# Altium footprint library Molex FFC - FPC Connectors (SMT).PcbLib: 638 footprints (part 31 of 40)
Each footprint in its own frame and in the unit in brackets; x right, y up, seen from the top. Pads: shape width x height; smd on the part's side, far side on the other; paste and mask are expansions set on the pad; w line width, h text height; cw(c..) or ccw(c..) is an arc to the next point about the centre after c.
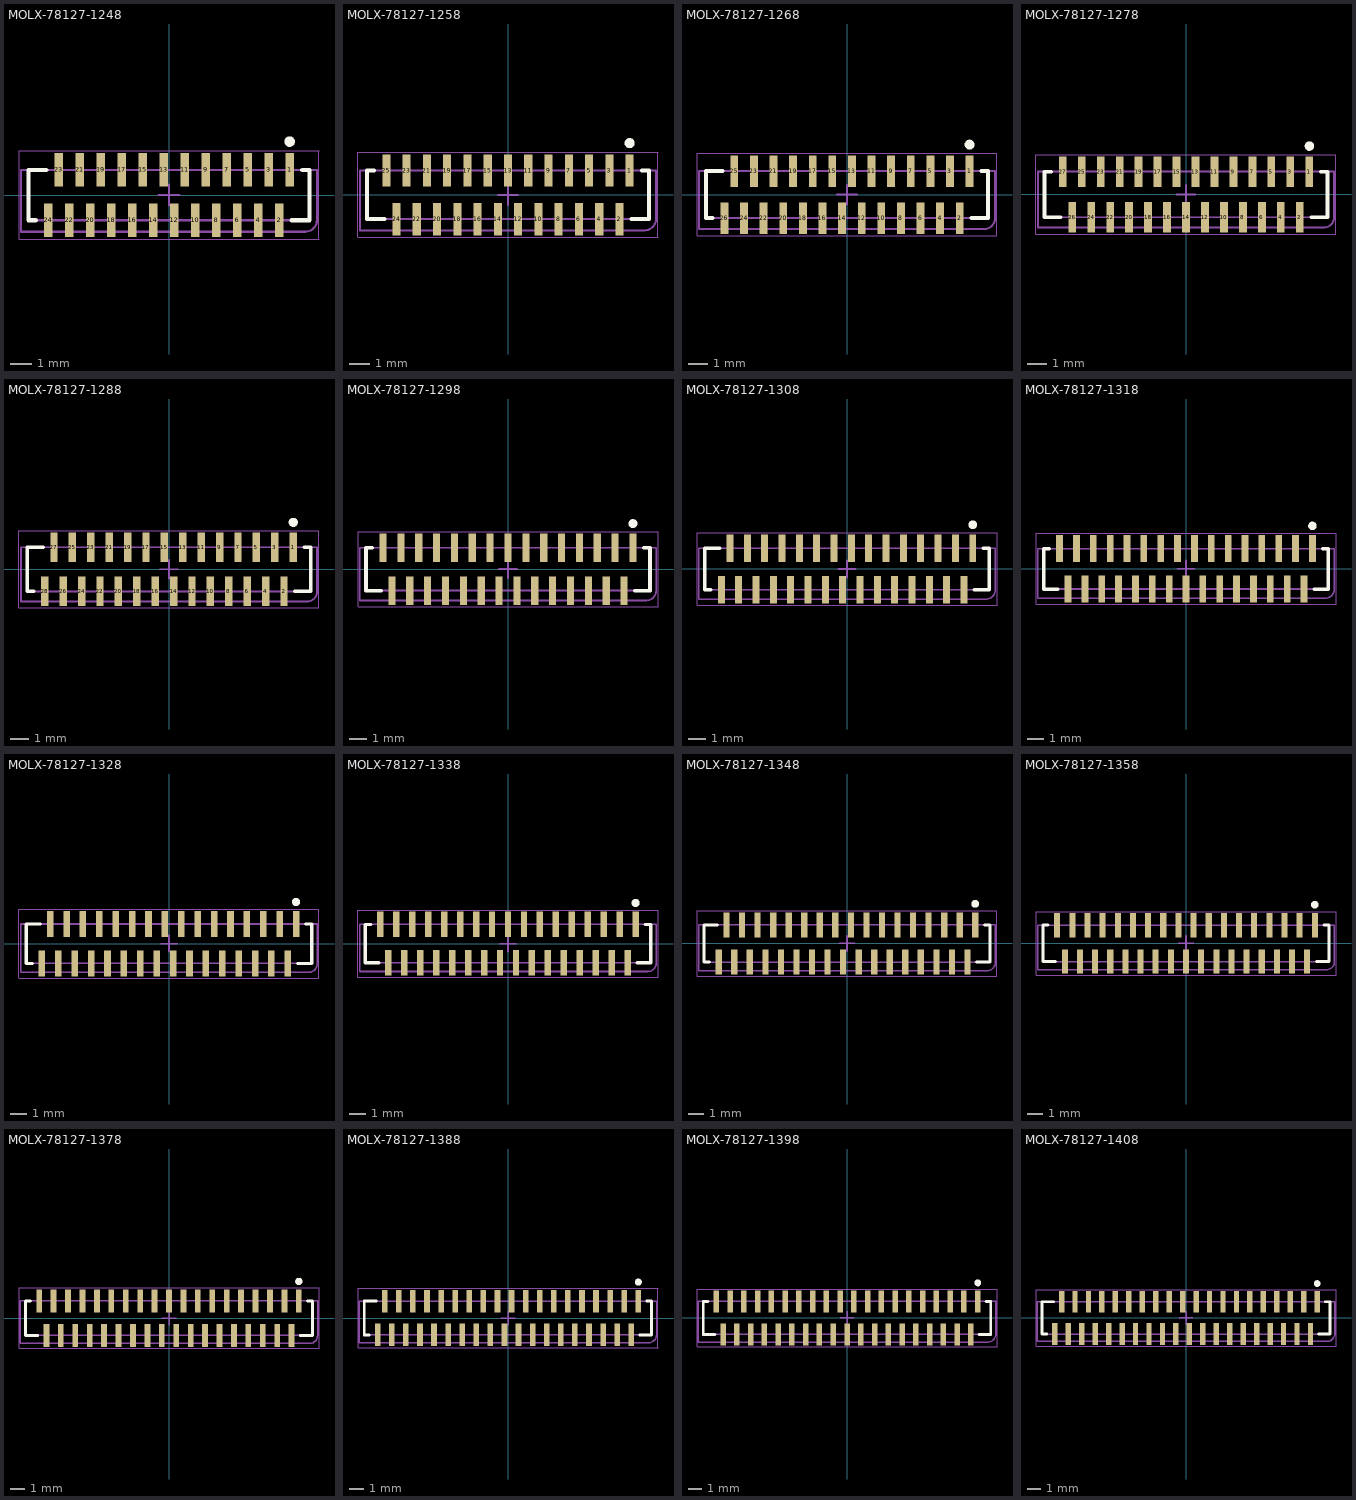
[diagram p30: the footprints below, top view; thin cyan lines are the x and y axes]

## MOLX-78127-1248 [mm] "FPC Connector, 24-Leads, Vertical, Pitch 0.5 mm, Mated Height 4.1 mm, SMT"
height 4.112
pads (24):
  rect 0.4x1.6 smd: 1(5.75,1.2) 2(5.25,-1.2) 3(4.75,1.2) 4(4.25,-1.2) 5(3.75,1.2) 6(3.25,-1.2) 7(2.75,1.2) 8(2.25,-1.2) 9(1.75,1.2) 10(1.25,-1.2) 11(0.75,1.2) 12(0.25,-1.2) 13(-0.25,1.2) 14(-0.75,-1.2) 15(-1.25,1.2) 16(-1.75,-1.2) 17(-2.25,1.2) 18(-2.75,-1.2) 19(-3.25,1.2) 20(-3.75,-1.2) 21(-4.25,1.2) 22(-4.75,-1.2) 23(-5.25,1.2) 24(-5.75,-1.2)
Top Overlay:
  circle w0.25: c5.75,2.55 r0.125
  lines w0.2: -6.35,-1.2 -6.7,-1.2 -6.7,1.2 -5.85,1.2 ; 5.85,-1.2 6.7,-1.2 6.7,1.2 6.35,1.2
Mechanical 13:
  lines w0.1: -6.7,1.2 -6.7,-1.2 6.7,-1.2 6.7,1.2 ; -7.05,-1.75 -7.05,1.2 7.05,1.2 7.05,-1.2 cw(c6.5,-1.2) 6.5,-1.75 -7.05,-1.75 ; -7.05,-1.75 -7.05,-1.75
Mechanical 15:
  lines w0.05: -7.15,-2.1 7.15,-2.1 7.15,2.1 -7.15,2.1 -7.15,-2.1
  lines w0.1: -0.5,0 0.5,0 ; 0,-0.5 0,0.5
3D body: height 0.25, standoff 0, extent -7.05,-1.75 7.05,1.7

## MOLX-78127-1258 [mm] "FPC Connector, 25-Leads, Vertical, Pitch 0.5 mm, Mated Height 4.1 mm, SMT"
height 4.112
pads (25):
  rect 0.4x1.6 smd: 1(6,1.2) 2(5.5,-1.2) 3(5,1.2) 4(4.5,-1.2) 5(4,1.2) 6(3.5,-1.2) 7(3,1.2) 8(2.5,-1.2) 9(2,1.2) 10(1.5,-1.2) 11(1,1.2) 12(0.5,-1.2) 13(0,1.2) 14(-0.5,-1.2) 15(-1,1.2) 16(-1.5,-1.2) 17(-2,1.2) 18(-2.5,-1.2) 19(-3,1.2) 20(-3.5,-1.2) 21(-4,1.2) 22(-4.5,-1.2) 23(-5,1.2) 24(-5.5,-1.2) 25(-6,1.2)
Top Overlay:
  circle w0.25: c6,2.55 r0.125
  lines w0.2: -6.6,1.2 -6.95,1.2 -6.95,-1.2 -6.1,-1.2 ; 6.1,-1.2 6.95,-1.2 6.95,1.2 6.6,1.2
Mechanical 13:
  lines w0.1: -6.95,1.2 -6.95,-1.2 6.95,-1.2 6.95,1.2 ; -7.3,-1.75 6.75,-1.75 ccw(c6.75,-1.2) 7.3,-1.2 7.3,1.2 -7.3,1.2 -7.3,-1.75
Mechanical 15:
  lines w0.05: -7.4,-2.1 7.4,-2.1 7.4,2.1 -7.4,2.1 -7.4,-2.1
  lines w0.1: -0.5,0 0.5,0 ; 0,-0.5 0,0.5
3D body: height 0.25, standoff 0, extent -7.3,-1.75 7.3,1.7

## MOLX-78127-1268 [mm] "FPC Connector, 26-Leads, Vertical, Pitch 0.5 mm, Mated Height 4.1 mm, SMT"
height 4.112
pads (26):
  rect 0.4x1.6 smd: 1(6.25,1.2) 2(5.75,-1.2) 3(5.25,1.2) 4(4.75,-1.2) 5(4.25,1.2) 6(3.75,-1.2) 7(3.25,1.2) 8(2.75,-1.2) 9(2.25,1.2) 10(1.75,-1.2) 11(1.25,1.2) 12(0.75,-1.2) 13(0.25,1.2) 14(-0.25,-1.2) 15(-0.75,1.2) 16(-1.25,-1.2) 17(-1.75,1.2) 18(-2.25,-1.2) 19(-2.75,1.2) 20(-3.25,-1.2) 21(-3.75,1.2) 22(-4.25,-1.2) 23(-4.75,1.2) 24(-5.25,-1.2) 25(-5.75,1.2) 26(-6.25,-1.2)
Top Overlay:
  circle w0.25: c6.25,2.55 r0.125
  lines w0.2: -6.85,-1.2 -7.2,-1.2 -7.2,1.2 -6.35,1.2 ; 6.35,-1.2 7.2,-1.2 7.2,1.2 6.85,1.2
Mechanical 13:
  lines w0.1: -7.2,1.2 -7.2,-1.2 7.2,-1.2 7.2,1.2 ; -7.55,-1.75 -7.55,1.2 7.55,1.2 7.55,-1.2 cw(c7,-1.2) 7,-1.75 -7.55,-1.75
Mechanical 15:
  lines w0.05: -7.65,-2.1 -7.65,2.1 7.65,2.1 7.65,-2.1 -7.65,-2.1
  lines w0.1: -0.5,0 0.5,0 ; 0,-0.5 0,0.5
3D body: height 0.25, standoff 0, extent -7.55,-1.75 7.55,1.7

## MOLX-78127-1278 [mm] "FPC Connector, 27-Leads, Vertical, Pitch 0.5 mm, Mated Height 4.1 mm, SMT"
height 4.112
pads (27):
  rect 0.4x1.6 smd: 1(6.5,1.2) 2(6,-1.2) 3(5.5,1.2) 4(5,-1.2) 5(4.5,1.2) 6(4,-1.2) 7(3.5,1.2) 8(3,-1.2) 9(2.5,1.2) 10(2,-1.2) 11(1.5,1.2) 12(1,-1.2) 13(0.5,1.2) 14(0,-1.2) 15(-0.5,1.2) 16(-1,-1.2) 17(-1.5,1.2) 18(-2,-1.2) 19(-2.5,1.2) 20(-3,-1.2) 21(-3.5,1.2) 22(-4,-1.2) 23(-4.5,1.2) 24(-5,-1.2) 25(-5.5,1.2) 26(-6,-1.2) 27(-6.5,1.2)
Top Overlay:
  circle w0.25: c6.5,2.55 r0.125
  lines w0.2: -7.1,1.2 -7.45,1.2 -7.45,-1.2 -6.6,-1.2 ; 6.6,-1.2 7.45,-1.2 7.45,1.2 7.1,1.2
Mechanical 13:
  lines w0.1: -7.45,1.2 -7.45,-1.2 7.45,-1.2 7.45,1.2 ; -7.8,-1.75 7.249,-1.75 ccw(c7.25,-1.2) 7.8,-1.2 7.8,1.2 -7.8,1.2 -7.8,-1.75
Mechanical 15:
  lines w0.05: -7.9,-2.1 7.9,-2.1 7.9,2.1 -7.9,2.1 -7.9,-2.1
  lines w0.1: -0.5,0 0.5,0 ; 0,-0.5 0,0.5
3D body: height 0.25, standoff 0, extent -7.8,-1.75 7.8,1.7

## MOLX-78127-1288 [mm] "FPC Connector, 28-Leads, Vertical, Pitch 0.5 mm, Mated Height 4.1 mm, SMT"
height 4.112
pads (28):
  rect 0.4x1.6 smd: 1(6.75,1.2) 2(6.25,-1.2) 3(5.75,1.2) 4(5.25,-1.2) 5(4.75,1.2) 6(4.25,-1.2) 7(3.75,1.2) 8(3.25,-1.2) 9(2.75,1.2) 10(2.25,-1.2) 11(1.75,1.2) 12(1.25,-1.2) 13(0.75,1.2) 14(0.25,-1.2) 15(-0.25,1.2) 16(-0.75,-1.2) 17(-1.25,1.2) 18(-1.75,-1.2) 19(-2.25,1.2) 20(-2.75,-1.2) 21(-3.25,1.2) 22(-3.75,-1.2) 23(-4.25,1.2) 24(-4.75,-1.2) 25(-5.25,1.2) 26(-5.75,-1.2) 27(-6.25,1.2) 28(-6.75,-1.2)
Top Overlay:
  circle w0.25: c6.75,2.55 r0.125
  lines w0.2: -7.35,-1.2 -7.7,-1.2 -7.7,1.2 -6.85,1.2 ; 6.85,-1.2 7.7,-1.2 7.7,1.2 7.35,1.2
Mechanical 13:
  lines w0.1: -7.7,1.2 -7.7,-1.2 7.7,-1.2 7.7,1.2 ; -8.05,-1.75 -8.05,1.2 8.05,1.2 8.05,-1.2 cw(c7.5,-1.2) 7.5,-1.75 -8.05,-1.75
Mechanical 15:
  lines w0.05: -8.15,-2.1 -8.15,2.1 8.15,2.1 8.15,-2.1 -8.15,-2.1
  lines w0.1: -0.5,0 0.5,0 ; 0,-0.5 0,0.5
3D body: height 0.25, standoff 0, extent -8.05,-1.75 8.05,1.7

## MOLX-78127-1298 [mm] "FPC Connector, 29-Leads, Vertical, Pitch 0.5 mm, Mated Height 4.1 mm, SMT"
height 4.112
pads (29):
  rect 0.4x1.6 smd: 1(7,1.2) 2(6.5,-1.2) 3(6,1.2) 4(5.5,-1.2) 5(5,1.2) 6(4.5,-1.2) 7(4,1.2) 8(3.5,-1.2) 9(3,1.2) 10(2.5,-1.2) 11(2,1.2) 12(1.5,-1.2) 13(1,1.2) 14(0.5,-1.2) 15(0,1.2) 16(-0.5,-1.2) 17(-1,1.2) 18(-1.5,-1.2) 19(-2,1.2) 20(-2.5,-1.2) 21(-3,1.2) 22(-3.5,-1.2) 23(-4,1.2) 24(-4.5,-1.2) 25(-5,1.2) 26(-5.5,-1.2) 27(-6,1.2) 28(-6.5,-1.2) 29(-7,1.2)
Top Overlay:
  circle w0.25: c7,2.55 r0.125
  lines w0.2: -7.6,1.2 -7.95,1.2 -7.95,-1.2 -7.1,-1.2 ; 7.1,-1.2 7.95,-1.2 7.95,1.2 7.6,1.2
Mechanical 13:
  lines w0.1: -7.95,1.2 -7.95,-1.2 7.95,-1.2 7.95,1.2 ; -8.3,-1.75 7.75,-1.75 ccw(c7.75,-1.2) 8.3,-1.2 8.3,1.2 -8.3,1.2 -8.3,-1.75
Mechanical 15:
  lines w0.05: -8.4,-2.1 8.4,-2.1 8.4,2.1 -8.4,2.1 -8.4,-2.1
  lines w0.1: -0.5,0 0.5,0 ; 0,-0.5 0,0.5
3D body: height 0.25, standoff 0, extent -8.3,-1.75 8.3,1.7

## MOLX-78127-1308 [mm] "FPC Connector, 30-Leads, Vertical, Pitch 0.5 mm, Mated Height 4.1 mm, SMT"
height 4.112
pads (30):
  rect 0.4x1.6 smd: 1(7.25,1.2) 2(6.75,-1.2) 3(6.25,1.2) 4(5.75,-1.2) 5(5.25,1.2) 6(4.75,-1.2) 7(4.25,1.2) 8(3.75,-1.2) 9(3.25,1.2) 10(2.75,-1.2) 11(2.25,1.2) 12(1.75,-1.2) 13(1.25,1.2) 14(0.75,-1.2) 15(0.25,1.2) 16(-0.25,-1.2) 17(-0.75,1.2) 18(-1.25,-1.2) 19(-1.75,1.2) 20(-2.25,-1.2) 21(-2.75,1.2) 22(-3.25,-1.2) 23(-3.75,1.2) 24(-4.25,-1.2) 25(-4.75,1.2) 26(-5.25,-1.2) 27(-5.75,1.2) 28(-6.25,-1.2) 29(-6.75,1.2) 30(-7.25,-1.2)
Top Overlay:
  circle w0.25: c7.25,2.55 r0.125
  lines w0.2: -7.85,-1.2 -8.2,-1.2 -8.2,1.2 -7.35,1.2 ; 7.35,-1.2 8.2,-1.2 8.2,1.2 7.85,1.2
Mechanical 13:
  lines w0.1: -8.2,1.2 -8.2,-1.2 8.2,-1.2 8.2,1.2 ; -8.55,-1.75 -8.55,1.2 8.55,1.2 8.55,-1.2 cw(c8,-1.2) 8,-1.75 -8.55,-1.75
Mechanical 15:
  lines w0.05: -8.65,-2.1 -8.65,2.1 8.65,2.1 8.65,-2.1 -8.65,-2.1
  lines w0.1: -0.5,0 0.5,0 ; 0,-0.5 0,0.5
3D body: height 0.25, standoff 0, extent -8.55,-1.75 8.55,1.7

## MOLX-78127-1318 [mm] "FPC Connector, 31-Leads, Vertical, Pitch 0.5 mm, Mated Height 4.1 mm, SMT"
height 4.112
pads (31):
  rect 0.4x1.6 smd: 1(7.5,1.2) 2(7,-1.2) 3(6.5,1.2) 4(6,-1.2) 5(5.5,1.2) 6(5,-1.2) 7(4.5,1.2) 8(4,-1.2) 9(3.5,1.2) 10(3,-1.2) 11(2.5,1.2) 12(2,-1.2) 13(1.5,1.2) 14(1,-1.2) 15(0.5,1.2) 16(0,-1.2) 17(-0.5,1.2) 18(-1,-1.2) 19(-1.5,1.2) 20(-2,-1.2) 21(-2.5,1.2) 22(-3,-1.2) 23(-3.5,1.2) 24(-4,-1.2) 25(-4.5,1.2) 26(-5,-1.2) 27(-5.5,1.2) 28(-6,-1.2) 29(-6.5,1.2) 30(-7,-1.2) 31(-7.5,1.2)
Top Overlay:
  circle w0.25: c7.5,2.55 r0.125
  lines w0.2: -8.1,1.2 -8.45,1.2 -8.45,-1.2 -7.6,-1.2 ; 7.6,-1.2 8.45,-1.2 ; 8.1,1.2 8.45,1.2 8.45,-1.2
Mechanical 13:
  lines w0.1: -8.45,1.2 -8.45,-1.2 8.45,-1.2 8.45,1.2 ; -8.8,-1.75 -8.8,1.2 8.8,1.2 8.8,-1.2 cw(c8.25,-1.2) 8.25,-1.75 -8.8,-1.75
Mechanical 15:
  lines w0.05: -8.9,-2.1 -8.9,2.1 8.9,2.1 8.9,-2.1 -8.9,-2.1
  lines w0.1: -0.5,0 0.5,0 ; 0,-0.5 0,0.5
3D body: height 0.25, standoff 0, extent -8.8,-1.75 8.8,1.7

## MOLX-78127-1328 [mm] "FPC Connector, 32-Leads, Vertical, Pitch 0.5 mm, Mated Height 4.1 mm, SMT"
height 4.112
pads (32):
  rect 0.4x1.6 smd: 1(7.75,1.2) 2(7.25,-1.2) 3(6.75,1.2) 4(6.25,-1.2) 5(5.75,1.2) 6(5.25,-1.2) 7(4.75,1.2) 8(4.25,-1.2) 9(3.75,1.2) 10(3.25,-1.2) 11(2.75,1.2) 12(2.25,-1.2) 13(1.75,1.2) 14(1.25,-1.2) 15(0.75,1.2) 16(0.25,-1.2) 17(-0.25,1.2) 18(-0.75,-1.2) 19(-1.25,1.2) 20(-1.75,-1.2) 21(-2.25,1.2) 22(-2.75,-1.2) 23(-3.25,1.2) 24(-3.75,-1.2) 25(-4.25,1.2) 26(-4.75,-1.2) 27(-5.25,1.2) 28(-5.75,-1.2) 29(-6.25,1.2) 30(-6.75,-1.2) 31(-7.25,1.2) 32(-7.75,-1.2)
Top Overlay:
  circle w0.25: c7.75,2.55 r0.125
  lines w0.2: -8.35,-1.2 -8.7,-1.2 -8.7,1.2 -7.85,1.2 ; 7.85,-1.2 8.7,-1.2 8.7,1.2 8.35,1.2
Mechanical 13:
  lines w0.1: -8.7,1.2 -8.7,-1.2 8.7,-1.2 8.7,1.2 ; -9.05,-1.75 -9.05,1.2 9.05,1.2 9.05,-1.2 cw(c8.5,-1.2) 8.5,-1.75 -9.05,-1.75
Mechanical 15:
  lines w0.05: -9.15,-2.1 -9.15,2.1 9.15,2.1 9.15,-2.1 -9.15,-2.1
  lines w0.1: -0.5,0 0.5,0 ; 0,-0.5 0,0.5
3D body: height 0.25, standoff 0, extent -9.05,-1.75 9.05,1.7

## MOLX-78127-1338 [mm] "FPC Connector, 33-Leads, Vertical, Pitch 0.5 mm, Mated Height 4.1 mm, SMT"
height 4.112
pads (33):
  rect 0.4x1.6 smd: 1(8,1.2) 2(7.5,-1.2) 3(7,1.2) 4(6.5,-1.2) 5(6,1.2) 6(5.5,-1.2) 7(5,1.2) 8(4.5,-1.2) 9(4,1.2) 10(3.5,-1.2) 11(3,1.2) 12(2.5,-1.2) 13(2,1.2) 14(1.5,-1.2) 15(1,1.2) 16(0.5,-1.2) 17(0,1.2) 18(-0.5,-1.2) 19(-1,1.2) 20(-1.5,-1.2) 21(-2,1.2) 22(-2.5,-1.2) 23(-3,1.2) 24(-3.5,-1.2) 25(-4,1.2) 26(-4.5,-1.2) 27(-5,1.2) 28(-5.5,-1.2) 29(-6,1.2) 30(-6.5,-1.2) 31(-7,1.2) 32(-7.5,-1.2) 33(-8,1.2)
Top Overlay:
  circle w0.25: c8,2.55 r0.125
  lines w0.2: -8.6,1.2 -8.95,1.2 -8.95,-1.2 -8.1,-1.2 ; 8.1,-1.2 8.95,-1.2 8.95,1.2 8.6,1.2
Mechanical 13:
  lines w0.1: -8.95,1.2 -8.95,-1.2 8.95,-1.2 8.95,1.2 ; 8.75,-1.75 -9.3,-1.75 -9.3,1.2 9.3,1.2 9.3,-1.2 cw(c8.75,-1.2) 8.75,-1.75
Mechanical 15:
  lines w0.05: -9.4,-2.1 9.4,-2.1 9.4,2.1 -9.4,2.1 -9.4,-2.1
  lines w0.1: -0.5,0 0.5,0 ; 0,-0.5 0,0.5
3D body: height 0.25, standoff 0, extent -9.3,-1.75 9.3,1.7

## MOLX-78127-1348 [mm] "FPC Connector, 34-Leads, Vertical, Pitch 0.5 mm, Mated Height 4.1 mm, SMT"
height 4.112
pads (34):
  rect 0.4x1.6 smd: 1(8.25,1.2) 2(7.75,-1.2) 3(7.25,1.2) 4(6.75,-1.2) 5(6.25,1.2) 6(5.75,-1.2) 7(5.25,1.2) 8(4.75,-1.2) 9(4.25,1.2) 10(3.75,-1.2) 11(3.25,1.2) 12(2.75,-1.2) 13(2.25,1.2) 14(1.75,-1.2) 15(1.25,1.2) 16(0.75,-1.2) 17(0.25,1.2) 18(-0.25,-1.2) 19(-0.75,1.2) 20(-1.25,-1.2) 21(-1.75,1.2) 22(-2.25,-1.2) 23(-2.75,1.2) 24(-3.25,-1.2) 25(-3.75,1.2) 26(-4.25,-1.2) 27(-4.75,1.2) 28(-5.25,-1.2) 29(-5.75,1.2) 30(-6.25,-1.2) 31(-6.75,1.2) 32(-7.25,-1.2) 33(-7.75,1.2) 34(-8.25,-1.2)
Top Overlay:
  circle w0.25: c8.25,2.55 r0.125
  lines w0.2: -8.85,-1.2 -9.2,-1.2 -9.2,1.2 -8.35,1.2 ; 8.35,-1.2 9.2,-1.2 9.2,1.2 8.85,1.2
Mechanical 13:
  lines w0.1: -9.55,-1.75 -9.55,1.2 9.55,1.2 9.549,-1.2 cw(c9,-1.2) 9,-1.75 -9.55,-1.75 ; -9.2,1.2 -9.2,-1.2 9.2,-1.2 9.2,1.2
Mechanical 15:
  lines w0.05: -9.65,-2.1 -9.65,2.1 9.65,2.1 9.65,-2.1 -9.65,-2.1
  lines w0.1: -0.5,0 0.5,0 ; 0,-0.5 0,0.5
3D body: height 0.25, standoff 0, extent -9.55,-1.75 9.55,1.7

## MOLX-78127-1358 [mm] "FPC Connector, 35-Leads, Vertical, Pitch 0.5 mm, Mated Height 4.1 mm, SMT"
height 4.112
pads (35):
  rect 0.4x1.6 smd: 1(8.5,1.2) 2(8,-1.2) 3(7.5,1.2) 4(7,-1.2) 5(6.5,1.2) 6(6,-1.2) 7(5.5,1.2) 8(5,-1.2) 9(4.5,1.2) 10(4,-1.2) 11(3.5,1.2) 12(3,-1.2) 13(2.5,1.2) 14(2,-1.2) 15(1.5,1.2) 16(1,-1.2) 17(0.5,1.2) 18(0,-1.2) 19(-0.5,1.2) 20(-1,-1.2) 21(-1.5,1.2) 22(-2,-1.2) 23(-2.5,1.2) 24(-3,-1.2) 25(-3.5,1.2) 26(-4,-1.2) 27(-4.5,1.2) 28(-5,-1.2) 29(-5.5,1.2) 30(-6,-1.2) 31(-6.5,1.2) 32(-7,-1.2) 33(-7.5,1.2) 34(-8,-1.2) 35(-8.5,1.2)
Top Overlay:
  circle w0.25: c8.5,2.55 r0.125
  lines w0.2: -9.1,1.2 -9.45,1.2 -9.45,-1.2 -8.6,-1.2 ; 8.6,-1.2 9.45,-1.2 9.45,1.2 9.1,1.2
Mechanical 13:
  lines w0.1: -9.45,1.2 -9.45,-1.2 9.45,-1.2 9.45,1.199 ; -9.8,-1.75 9.25,-1.75 ccw(c9.25,-1.2) 9.8,-1.2 9.8,1.2 -9.8,1.2 -9.8,-1.75
Mechanical 15:
  lines w0.05: -9.9,-2.1 9.9,-2.1 9.9,2.1 -9.9,2.1 -9.9,-2.1
  lines w0.1: -0.5,0 0.5,0 ; 0,-0.5 0,0.5
3D body: height 0.25, standoff 0, extent -9.8,-1.75 9.8,1.7

## MOLX-78127-1378 [mm] "FPC Connector, 37-Leads, Vertical, Pitch 0.5 mm, Mated Height 4.1 mm, SMT"
height 4.112
pads (37):
  rect 0.4x1.6 smd: 1(9,1.2) 2(8.5,-1.2) 3(8,1.2) 4(7.5,-1.2) 5(7,1.2) 6(6.5,-1.2) 7(6,1.2) 8(5.5,-1.2) 9(5,1.2) 10(4.5,-1.2) 11(4,1.2) 12(3.5,-1.2) 13(3,1.2) 14(2.5,-1.2) 15(2,1.2) 16(1.5,-1.2) 17(1,1.2) 18(0.5,-1.2) 19(0,1.2) 20(-0.5,-1.2) 21(-1,1.2) 22(-1.5,-1.2) 23(-2,1.2) 24(-2.5,-1.2) 25(-3,1.2) 26(-3.5,-1.2) 27(-4,1.2) 28(-4.5,-1.2) 29(-5,1.2) 30(-5.5,-1.2) 31(-6,1.2) 32(-6.5,-1.2) 33(-7,1.2) 34(-7.5,-1.2) 35(-8,1.2) 36(-8.5,-1.2) 37(-9,1.2)
Top Overlay:
  circle w0.25: c9,2.55 r0.125
  lines w0.2: -9.6,1.2 -9.95,1.2 -9.95,-1.2 -9.1,-1.2 ; 9.1,-1.2 9.95,-1.2 9.95,1.2 9.6,1.2
Mechanical 13:
  lines w0.1: -9.95,1.2 -9.95,-1.2 9.95,-1.2 9.95,1.2 ; -10.3,-1.75 9.75,-1.75 ccw(c9.75,-1.2) 10.3,-1.2 10.3,1.2 -10.3,1.2 -10.3,-1.75
Mechanical 15:
  lines w0.05: -10.4,-2.1 10.4,-2.1 10.4,2.1 -10.4,2.1 -10.4,-2.1
  lines w0.1: -0.5,0 0.5,0 ; 0,-0.5 0,0.5
3D body: height 0.25, standoff 0, extent -10.3,-1.75 10.3,1.7

## MOLX-78127-1388 [mm] "FPC Connector, 38-Leads, Vertical, Pitch 0.5 mm, Mated Height 4.1 mm, SMT"
height 4.112
pads (38):
  rect 0.4x1.6 smd: 1(9.25,1.2) 2(8.75,-1.2) 3(8.25,1.2) 4(7.75,-1.2) 5(7.25,1.2) 6(6.75,-1.2) 7(6.25,1.2) 8(5.75,-1.2) 9(5.25,1.2) 10(4.75,-1.2) 11(4.25,1.2) 12(3.75,-1.2) 13(3.25,1.2) 14(2.75,-1.2) 15(2.25,1.2) 16(1.75,-1.2) 17(1.25,1.2) 18(0.75,-1.2) 19(0.25,1.2) 20(-0.25,-1.2) 21(-0.75,1.2) 22(-1.25,-1.2) 23(-1.75,1.2) 24(-2.25,-1.2) 25(-2.75,1.2) 26(-3.25,-1.2) 27(-3.75,1.2) 28(-4.25,-1.2) 29(-4.75,1.2) 30(-5.25,-1.2) 31(-5.75,1.2) 32(-6.25,-1.2) 33(-6.75,1.2) 34(-7.25,-1.2) 35(-7.75,1.2) 36(-8.25,-1.2) 37(-8.75,1.2) 38(-9.25,-1.2)
Top Overlay:
  circle w0.25: c9.25,2.55 r0.125
  lines w0.2: -9.85,-1.2 -10.2,-1.2 -10.2,1.2 -9.35,1.2 ; 9.35,-1.2 10.2,-1.2 10.2,1.2 9.85,1.2
Mechanical 13:
  lines w0.1: -10.2,1.2 -10.2,-1.2 10.2,-1.2 10.2,1.2 ; -10.55,-1.75 -10.55,1.2 10.55,1.2 10.55,-1.2 cw(c10,-1.2) 9.999,-1.75 -10.55,-1.75
Mechanical 15:
  lines w0.05: -10.65,-2.1 -10.65,2.1 10.65,2.1 10.65,-2.1 -10.65,-2.1
  lines w0.1: -0.5,0 0.5,0 ; 0,-0.5 0,0.5
3D body: height 0.25, standoff 0, extent -10.55,-1.75 10.55,1.7

## MOLX-78127-1398 [mm] "FPC Connector, 39-Leads, Vertical, Pitch 0.5 mm, Mated Height 4.1 mm, SMT"
height 4.112
pads (39):
  rect 0.4x1.6 smd: 1(9.5,1.2) 2(9,-1.2) 3(8.5,1.2) 4(8,-1.2) 5(7.5,1.2) 6(7,-1.2) 7(6.5,1.2) 8(6,-1.2) 9(5.5,1.2) 10(5,-1.2) 11(4.5,1.2) 12(4,-1.2) 13(3.5,1.2) 14(3,-1.2) 15(2.5,1.2) 16(2,-1.2) 17(1.5,1.2) 18(1,-1.2) 19(0.5,1.2) 20(0,-1.2) 21(-0.5,1.2) 22(-1,-1.2) 23(-1.5,1.2) 24(-2,-1.2) 25(-2.5,1.2) 26(-3,-1.2) 27(-3.5,1.2) 28(-4,-1.2) 29(-4.5,1.2) 30(-5,-1.2) 31(-5.5,1.2) 32(-6,-1.2) 33(-6.5,1.2) 34(-7,-1.2) 35(-7.5,1.2) 36(-8,-1.2) 37(-8.5,1.2) 38(-9,-1.2) 39(-9.5,1.2)
Top Overlay:
  circle w0.25: c9.5,2.55 r0.125
  lines w0.2: -10.1,1.2 -10.45,1.2 -10.45,-1.2 -9.6,-1.2 ; 9.6,-1.2 10.45,-1.2 10.45,1.2 10.1,1.2
Mechanical 13:
  lines w0.1: -10.45,1.2 -10.45,-1.2 10.45,-1.2 10.45,1.2 ; -10.8,-1.75 -10.8,1.2 10.8,1.2 10.8,-1.2 cw(c10.25,-1.2) 10.25,-1.75 -10.8,-1.75
Mechanical 15:
  lines w0.05: -10.9,-2.1 -10.9,2.1 10.9,2.1 10.9,-2.1 -10.9,-2.1
  lines w0.1: -0.5,0 0.5,0 ; 0,-0.5 0,0.5
3D body: height 0.25, standoff 0, extent -10.8,-1.75 10.8,1.7

## MOLX-78127-1408 [mm] "FPC Connector, 40-Leads, Vertical, Pitch 0.5 mm, Mated Height 4.1 mm, SMT"
height 4.112
pads (40):
  rect 0.4x1.6 smd: 1(9.75,1.2) 2(9.25,-1.2) 3(8.75,1.2) 4(8.25,-1.2) 5(7.75,1.2) 6(7.25,-1.2) 7(6.75,1.2) 8(6.25,-1.2) 9(5.75,1.2) 10(5.25,-1.2) 11(4.75,1.2) 12(4.25,-1.2) 13(3.75,1.2) 14(3.25,-1.2) 15(2.75,1.2) 16(2.25,-1.2) 17(1.75,1.2) 18(1.25,-1.2) 19(0.75,1.2) 20(0.25,-1.2) 21(-0.25,1.2) 22(-0.75,-1.2) 23(-1.25,1.2) 24(-1.75,-1.2) 25(-2.25,1.2) 26(-2.75,-1.2) 27(-3.25,1.2) 28(-3.75,-1.2) 29(-4.25,1.2) 30(-4.75,-1.2) 31(-5.25,1.2) 32(-5.75,-1.2) 33(-6.25,1.2) 34(-6.75,-1.2) 35(-7.25,1.2) 36(-7.75,-1.2) 37(-8.25,1.2) 38(-8.75,-1.2) 39(-9.25,1.2) 40(-9.75,-1.2)
Top Overlay:
  circle w0.25: c9.75,2.55 r0.125
  lines w0.2: -10.35,-1.2 -10.7,-1.2 -10.7,1.2 -9.85,1.2 ; 9.85,-1.2 10.7,-1.2 10.7,1.2 10.35,1.2
Mechanical 13:
  lines w0.1: -10.7,1.2 -10.7,-1.2 10.7,-1.2 10.7,1.2 ; -11.05,-1.75 10.5,-1.75 ccw(c10.5,-1.2) 11.05,-1.2 11.05,1.2 -11.05,1.2 -11.05,-1.75
Mechanical 15:
  lines w0.05: -11.15,-2.1 11.15,-2.1 11.15,2.1 -11.15,2.1 -11.15,-2.1
  lines w0.1: -0.5,0 0.5,0 ; 0,-0.5 0,0.5
3D body: height 0.25, standoff 0, extent -11.05,-1.75 11.05,1.7